# Altium footprint library Connectors.PCBLIB: 126 footprints (part 7 of 8)
Each footprint in its own frame and in the unit in brackets; x right, y up, seen from the top. Pads: shape width x height; smd on the part's side, far side on the other; paste and mask are expansions set on the pad; w line width, h text height; cw(c..) or ccw(c..) is an arc to the next point about the centre after c.
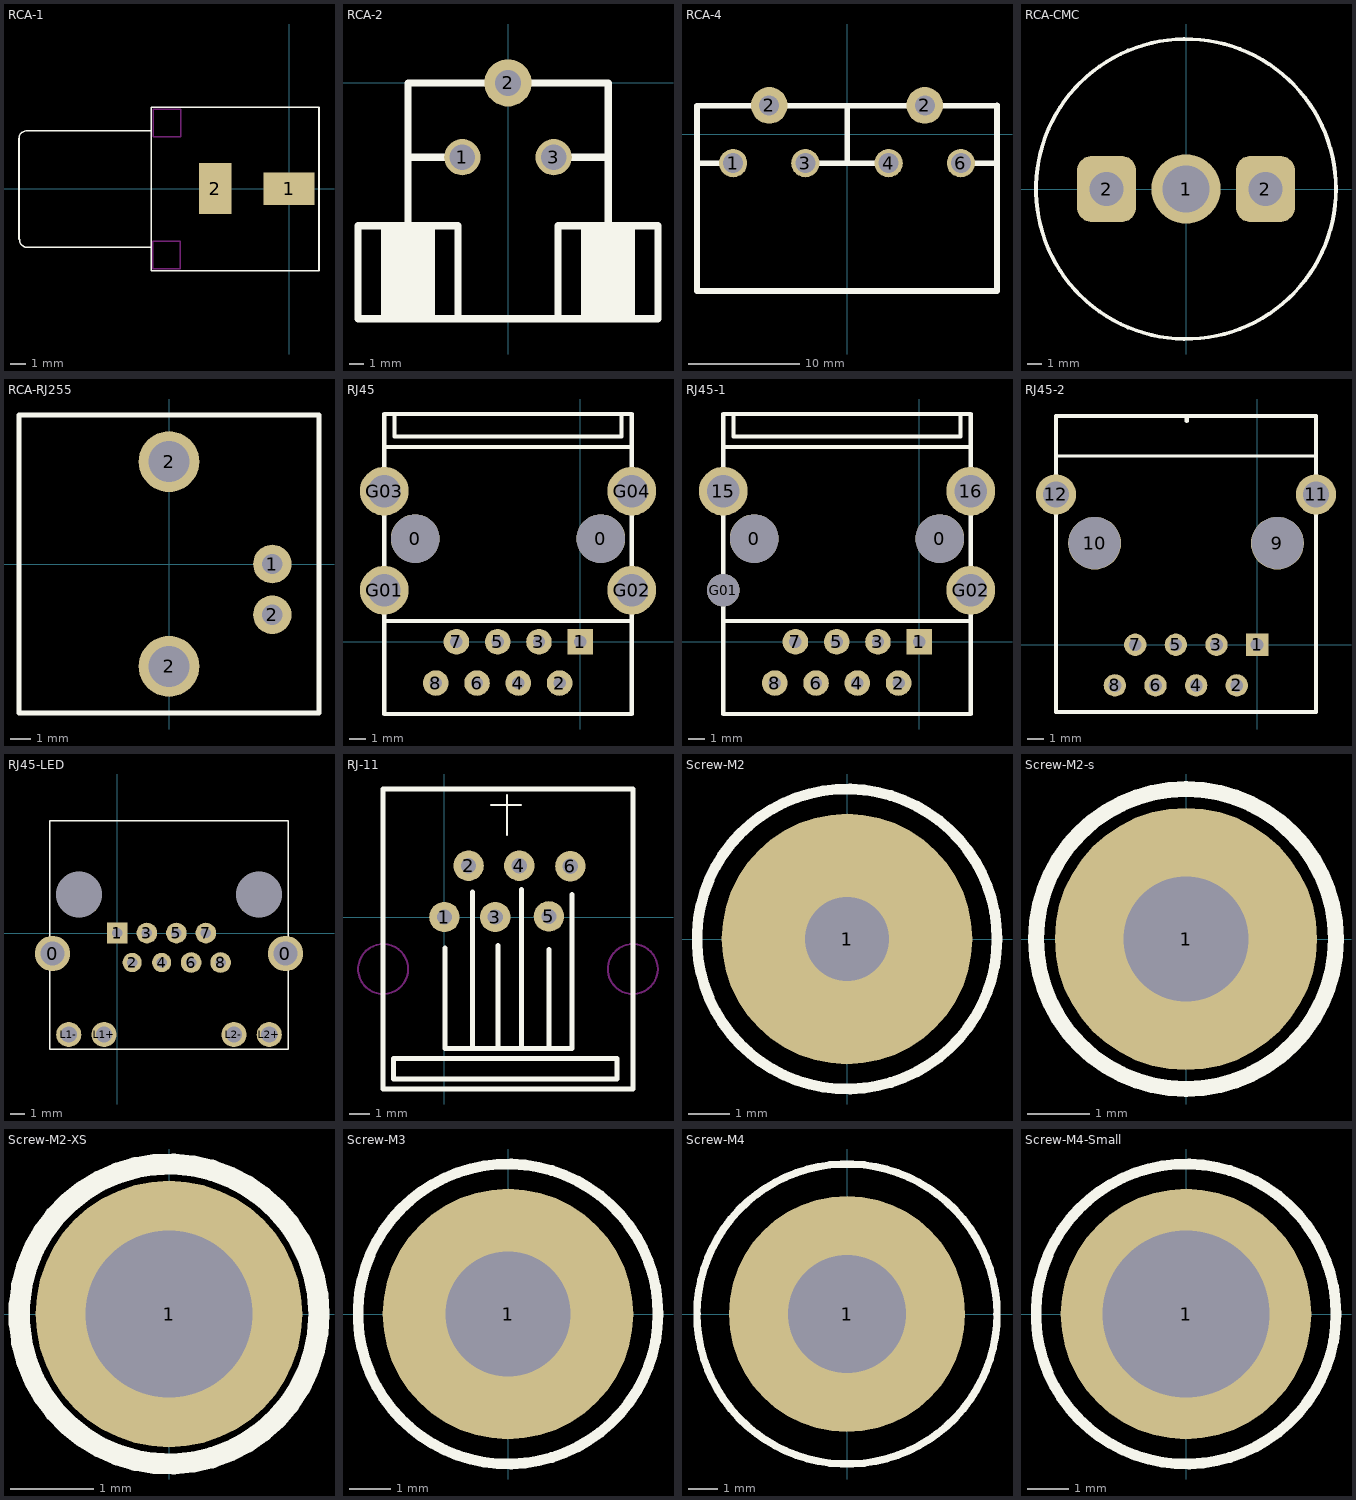
[diagram p6: the footprints below, top view; thin cyan lines are the x and y axes]

## RCA-1 [mm]
pads (2):
  rect 3.3x2.1 all layers, no hole: 1(0,0)
  rect 2.1x3.3 all layers, no hole: 2(-4.75,0)
Top Overlay:
  lines w0.1: -17.383,-3.242 -17.383,3.225 cw(c-16.883,3.225) -16.875,3.725 -8.875,3.725 ; -17.35,-3.275 ccw(c-16.85,-3.283) -16.85,-3.783 ; -16.875,-3.775 -8.875,-3.775 ; -8.875,-5.275 1.925,-5.275 1.925,5.225 -8.875,5.225 -8.875,-5.275
Keep-Out Layer:
  lines w0.1: -8.775,-5.125 -8.775,-3.375 -7,-3.375 -7,-5.15 -8.75,-5.15 -8.775,-5.125 ; -8.75,3.325 -6.975,3.325 -6.975,5.1 -8.75,5.1 -8.75,3.325
Mechanical 1:
  lines w0.1: -5.375,-1.225 -5.375,1.175 -4.175,1.175 -4.175,-1.225 -5.375,-1.225 ; -1.175,-0.625 1.225,-0.625 1.225,0.575 -1.175,0.575 -1.175,-0.625
3D body "CUI-DEFAULT.STEP": height 11.86, standoff -3.64, extent -17.628,-5 1.872,5

## RCA-2 [mm]
pads (3):
  round 2.54 hole 1.8: 1(-3.2,-5.2) 3(3.2,-5.2)
  round 3.3 hole 1.8: 2(0,0)
Top Overlay:
  rectangle: -8.738,-16.5 -5.309,-10
  rectangle: 5.283,-16.5 8.738,-10
  lines w0.254: -8.75,-16.5 -8.75,-10 ; -5.25,-16.5 -5.25,-10 ; 5.25,-16.5 5.25,-10 ; 8.75,-16.5 8.75,-10
  lines w0.508: -7,-5.2 -3.25,-5.2 ; -3.5,-16.5 -3.5,-10 -7,-10 -10.5,-10 -10.5,-16.5 -7,-16.5 ; 3.19,-5.2 7,-5.2 ; 3.5,-16.5 3.5,-10 7,-10 10.5,-10 10.5,-16.5 7.017,-16.5 7.017,0 ; 7,-16.5 -7,-16.5 ; 7,0 -7,0 -7,-16.5
3D body "CUI-RCJ-2273.STEP": height 28.01, standoff -4.39, extent -8.371,-19.634 12.029,0.166

## RCA-4 [mm]
pads (6):
  round 2.54 hole 1.8: 1(-10.25,-2.6) 3(-3.75,-2.6) 4(3.75,-2.6) 6(10.25,-2.6)
  round 3.3 hole 1.8: 2(-7,2.6) 2(7,2.6)
Top Overlay:
  lines w0.508: -13.483,-2.6 -10.25,-2.6 ; -3.81,-2.6 3.81,-2.6 ; 0.017,-2.505 0.017,2.575 ; 10.25,-2.6 13.467,-2.6 ; 12.971,2.575 13.479,2.575 ; 13.5,2.575 -13.5,2.575 -13.5,-14.1 13.5,-14.1 13.5,2.6
3D body "CUI-RCJ-411234.STEP": height 27.31, standoff -5.59, extent -17.324,-17.231 17.476,2.819

## RCA-CMC [mm] "CMC RCA Socket"
pads (3):
  round 4.7 hole 3.2: 1(0,0)
  rrect50% 4x4.5 hole 2.3 square: 2(-5.38,0) 2(5.38,0)
Top Overlay:
  circle w0.254: c0,0 r10.16

## RCA-RJ255 [mm] "RCA Socket"
pads (4):
  round 1.9 hole 1: 1(5.1,0) 2(5.1,-2.5)
  round 3 hole 2.02: 2(0,-5.05) 2(0,5.05)
Top Overlay:
  lines w0.254: -7.4,-7.35 7.4,-7.35 7.4,7.35 -7.4,7.35 -7.4,-7.35

## RJ45 [mil]
pads (14):
  round 118.11 hole 118.11: 0(-400,250) 0(50,250)
  rect 62x62 hole 30: 1(0,0)
  round 62 hole 30: 2(-50,-100) 3(-100,0) 4(-150,-100) 5(-200,0) 6(-250,-100) 7(-300,0) 8(-350,-100)
  round 118.11 hole 78.74: G01(-475,125) G02(125,125) G03(-475,365) G04(125,365)
Top Overlay:
  lines w10: -475,50 125,50 ; -475,472.24 125,472.24 ; -450,547.24 -450,497.24 100,497.24 100,547.24 ; -475,-175 -475,500 -475,552.18 125,552.18 125,500 125,-175 -475,-175
3D body "RJ45-8P-Pipe-Cat6.step": height 572.83, standoff -141.73, extent -523,-293.44 169.91,651.44

## RJ45-1 [mil]
pads (14):
  round 118.11 hole 118.11: 0(-400,250) 0(50,250)
  rect 62x62 hole 30: 1(0,0)
  round 62 hole 30: 2(-50,-100) 3(-100,0) 4(-150,-100) 5(-200,0) 6(-250,-100) 7(-300,0) 8(-350,-100)
  round 118.11 hole 78.74: 15(-475,365) 16(125,365) G02(125,125)
  round 78.74 hole 78.74: G01(-475,125)
Top Overlay:
  lines w10: -475,50 125,50 ; -475,472.24 125,472.24 ; -450,547.24 -450,497.24 100,497.24 100,547.24 ; -475,-175 -475,500 -475,552.18 125,552.18 125,500 125,-175 -475,-175
3D body "RJ45-8P-Pipe-Cat6.step": height 572.83, standoff -141.73, extent -523,-293.44 169.91,651.44

## RJ45-2 [mil]
pads (12):
  rect 55x55 hole 31.5: 1(0,0)
  round 55 hole 31.5: 2(-50,-100) 3(-100,0) 4(-150,-100) 5(-200,0) 6(-250,-100) 7(-300,0) 8(-350,-100)
  round 130 hole 127.95 unplated: 9(50,250) 10(-400,250)
  round 98.42 hole 62.99: 11(145,370) 12(-495,370)
Top Overlay:
  lines w8: -488.19,464.57 141.73,464.57
  lines w10: -495,-165.35 144.65,-165.35 145,-165 145,370 145,562.99 -495,562.99 -495,370 -495,-165 ; -173.23,551.18 -173.23,559.06
3D body "Mod-Jack-K122449007-Stig-W.STEP": height 127.85, standoff -555.12, extent -490,-172.17 139.92,556.17

## RJ45-LED [mm]
pads (16):
  round 2.4 hole 1.6: 0(-4.4,-1.39) 0(11.4,-1.39)
  rect 1.4x1.4 hole 0.7: 1(0,0)
  round 1.3 hole 0.7: 2(1,-2) 4(3,-2)
  round 1.4 hole 0.7: 3(2,0) 5(4,0) 6(5,-2) 7(6,0) 8(7,-2)
  round 1.7 hole 1.1: L1+(-0.9,-6.89) L1-(-3.3,-6.89) L2+(10.3,-6.89) L2-(7.9,-6.89)
  round 3.1 hole 3.1: ""(-2.6,2.61) ""(9.6,2.61)
Top Overlay:
  lines w0.1: -4.6,-7.89 11.6,-7.89 11.6,7.61 -4.6,7.61 -4.6,-7.89

## RJ-11 [mil]
height 590.55
pads (6):
  round 60 hole 30: 1(0,0) 2(47.48,101.1) 3(100,0) 4(147.48,101.1) 5(205.67,1.1) 6(247.87,100)
Top Overlay:
  lines w3.94: 91.49,220.45 150.55,220.45 ; 122.99,161.39 122.99,220.45 ; 122.99,216.51 122.99,240.14
  lines w10: 1.42,-61.1 1.42,-258.58 251.42,-258.58 251.42,43.86 ; 55.35,-258.58 55.35,48.9 ; 105.35,-258.58 105.35,-56.06 ; 151.42,-258.58 151.42,54.25 ; 206.14,-258.58 206.14,-64.25 ; 367.08,-338.58 -120.63,-338.58 -120.63,251.97 371.5,251.97 ; 371.18,-338.58 371.18,251.97 ; -100.63,-318.58 339.37,-318.58 339.37,-278.58 -100.63,-278.58 -100.63,-318.58
Keep-Out Layer:
  circle w3.94: c-120.63,-102.52 r49.21
  circle w3.94: c370.86,-102.52 r49.21

## Screw-M2 [mm]
pads (1):
  round 6 hole 2: 1(0,0)
Top Overlay:
  circle w0.254: c0,0 r3.592

## Screw-M2-s [mm]
pads (1):
  round 4.2 hole 2: 1(0,0)
Top Overlay:
  circle w0.254: c0,0 r2.4

## Screw-M2-XS [mm]
pads (1):
  round 3.2 hole 2: 1(0,0)
Top Overlay:
  circle w0.254: c0,0 r1.8

## Screw-M3 [mm]
pads (1):
  round 6 hole 3: 1(0,0)
Top Overlay:
  circle w0.254: c0,0 r3.592

## Screw-M4 [mm]
pads (1):
  round 8 hole 4: 1(0,0)
Top Overlay:
  circle w0.254: c0,0 r5.08

## Screw-M4-Small [mm]
pads (1):
  round 6 hole 4: 1(0,0)
Top Overlay:
  circle w0.254: c0,0 r3.592